# Altium footprint library ESKDPcbLib.PcbLib: 608 footprints (part 25 of 38)
Each footprint in its own frame and in the unit in brackets; x right, y up, seen from the top. Pads: shape width x height; smd on the part's side, far side on the other; paste and mask are expansions set on the pad; w line width, h text height; cw(c..) or ccw(c..) is an arc to the next point about the centre after c.
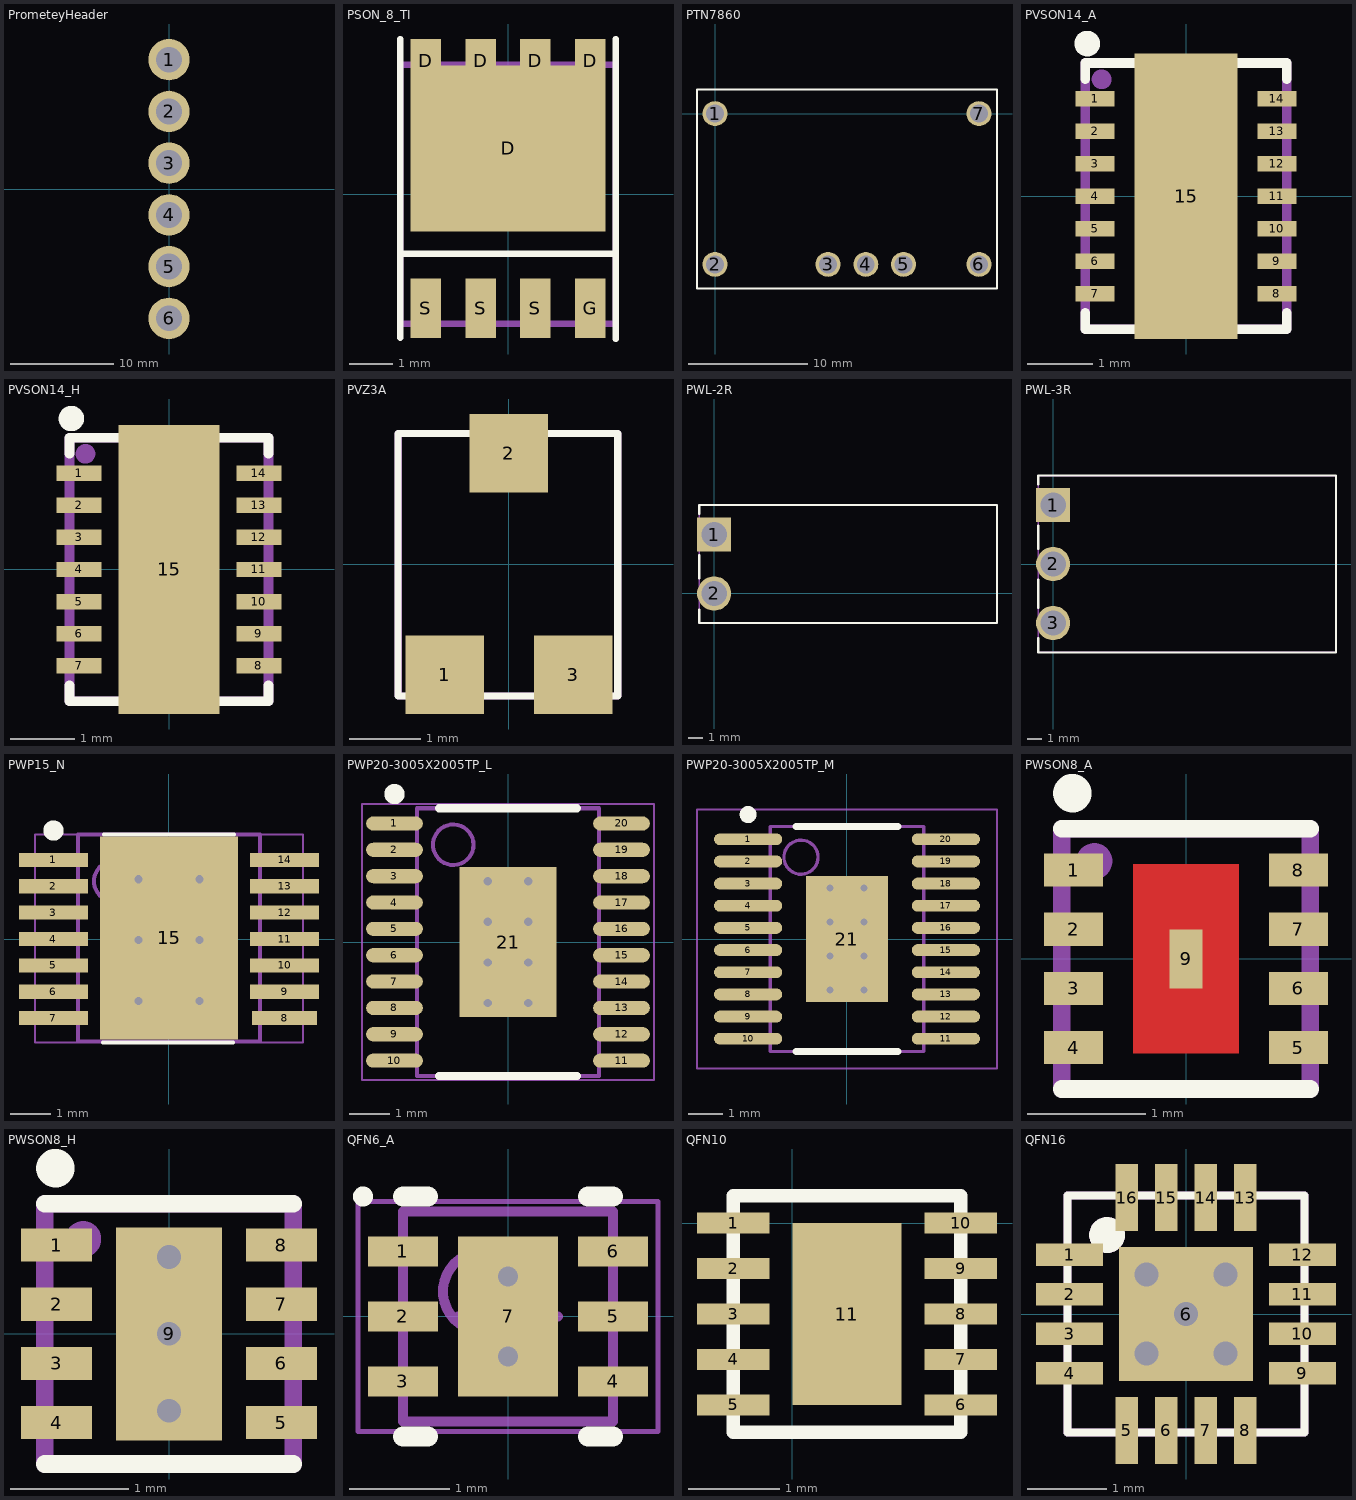
[diagram p24: the footprints below, top view; thin cyan lines are the x and y axes]

## PrometeyHeader [mm]
pads (6):
  round 4 hole 2.5: 1(0,12.5) 2(0,7.5) 3(0,2.5) 4(0,-2.5) 5(0,-7.5) 6(0,-12.5)

## PSON_8_TI [mm]
height 1
pads (9):
  rect 0.71x1 smd: D(-1.905,3.098) D(-0.635,3.098) D(0.635,3.098) D(1.905,3.098)
  rect 4.52x3.85 smd: D(0,1.064)
  rect 0.71x1.375 smd: G(1.905,-2.641) S(-1.905,-2.641) S(-0.635,-2.641) S(0.635,-2.641)
Top Overlay:
  lines w0.15: -2.5,-3.325 -2.5,3.6 ; -2.5,-1.375 2.5,-1.375 ; 2.5,-3.35 2.5,3.6
Mechanical 7:
  lines w0.15: -2.5,-3 -2.5,3 2.5,3 2.5,-3 -2.5,-3
Mechanical 10:
  text ".Designator" at -1.075,-4.2 h0.7
  text ".Comment" at -1.125,4.05 h0.7
3D body: height 1, standoff 0.05, extent -2.5,-3 2.5,3

## PTN7860 [mm]
pads (7):
  round 2.1 hole 1.5 mask+0: 1(0,0) 2(0,-12.7) 3(9.52,-12.7) 4(12.7,-12.7) 5(15.88,-12.7) 6(22.23,-12.7) 7(22.23,0)
Top Overlay:
  lines w0.15: -1.52,-14.73 -1.52,2.03 23.75,2.03 23.75,-14.73 -1.52,-14.73
3D body: height 9, standoff 2, extent -1.52,-14.73 23.75,2.03

## PVSON14_A [mm]
pads (15):
  rect 0.6x0.24 smd: 1(-1.4,1.5) 2(-1.4,1) 3(-1.4,0.5) 4(-1.4,0) 5(-1.4,-0.5) 6(-1.4,-1) 7(-1.4,-1.5) 8(1.4,-1.5) 9(1.4,-1) 10(1.4,-0.5) 11(1.4,0) 12(1.4,0.5) 13(1.4,1) 14(1.4,1.5)
  rect 1.58x4.4 smd: 15(0,0)
Top Overlay:
  circle w0.254: c-1.521,2.35 r0.071
  lines w0.15: -1.55,-1.8 -1.55,-2.05 1.55,-2.05 1.55,-1.8 ; -1.55,1.8 -1.55,2.05 1.55,2.05 1.55,1.8
Mechanical 7:
  circle w0.254: c-1.3,1.8 r0.025
  lines w0.15: -1.55,-2.05 1.55,-2.05 1.55,2.05 -1.55,2.05 -1.55,-2.05
Mechanical 10:
  text ".Designator" at -1.25,3.075 h0.8
  text ".Comment" at -1.225,2.5 h0.6
3D body: height 1, standoff 0, extent -1.575,-2.075 1.575,2.075

## PVSON14_H [mm]
pads (15):
  rect 0.7x0.24 smd: 1(-1.4,1.5) 2(-1.4,1) 3(-1.4,0.5) 4(-1.4,0) 5(-1.4,-0.5) 6(-1.4,-1) 7(-1.4,-1.5) 8(1.4,-1.5) 9(1.4,-1) 10(1.4,-0.5) 11(1.4,0) 12(1.4,0.5) 13(1.4,1) 14(1.4,1.5)
  rect 1.58x4.5 smd: 15(0,0)
Top Overlay:
  circle w0.254: c-1.521,2.35 r0.071
  lines w0.15: -1.55,-1.8 -1.55,-2.05 1.55,-2.05 1.55,-1.8 ; -1.55,1.8 -1.55,2.05 1.55,2.05 1.55,1.8
Mechanical 7:
  circle w0.254: c-1.3,1.8 r0.025
  lines w0.15: -1.55,-2.05 1.55,-2.05 1.55,2.05 -1.55,2.05 -1.55,-2.05
Mechanical 10:
  text ".Designator" at -1.25,3.075 h0.8
  text ".Comment" at -1.225,2.5 h0.6
3D body: height 1, standoff 0, extent -1.575,-2.075 1.575,2.075

## PVZ3A [mm] "подстроечный резистор"
pads (3):
  rect 1.1x1.1 smd: 1(-0.9,-1.55) 2(0,1.55) 3(0.9,-1.55)
Top Overlay:
  lines w0.1: -1.55,-1.85 -1.55,1.825 1.525,1.825 1.525,-1.85 -1.55,-1.85
Mechanical 7:
  lines w0.1: -1.55,-1.85 -1.55,1.825 1.525,1.825 1.525,-1.85 -1.55,-1.85
Mechanical 10:
  text ".Designator" at 2.175,-0.75 h1.52
  text ".Comment" at 2.225,0.35 h1.52
3D body: height 1.95, standoff 0, extent -1.55,-1.85 1.55,1.84

## PWL-2R [mm]
height 10.2
pads (2):
  rect 2.3x2.3 hole 1.7: 1(0,3.96)
  round 2.3 hole 1.7: 2(0,0)
Top Overlay:
  lines w0.15: -1,-1.98 19,-1.98 19,5.94 -1,5.94 -1,5.35 ; -1,-1.975 -1,-1.1 ; -1,1 -1,2.575
Mechanical 7:
  lines w0.1: -1,-1.98 -1,5.94 19,5.94 19,-1.98 -1,-1.98
Mechanical 10:
  text ".Designator" at 7.945,7.23 h0.8
  text ".Comment" at 7.955,6.66 h0.6
3D body: height 10.2, standoff 0, extent -1,-1.98 19,5.94

## PWL-3R [mm]
height 10.2
pads (3):
  rect 2.3x2.3 hole 1.7: 1(0,3.96)
  round 2.3 hole 1.7: 2(0,0) 3(0,-3.96)
Top Overlay:
  lines w0.15: -1,-4.975 -1,-5.94 19,-5.94 19,5.94 -1,5.94 -1,5.35 ; -1,-2.95 -1,-1.05 ; -1,1.025 -1,2.575
Mechanical 7:
  lines w0.1: -1,-5.94 -1,5.94 19,5.94 19,-5.94 -1,-5.94
Mechanical 10:
  text ".Comment" at 7.955,6.66 h0.6
  text ".Designator" at 7.945,7.23 h0.8
3D body: height 10.2, standoff 0, extent -1,-5.94 19,5.94

## PWP15_N [mm] "TSOP, 20-Leads, Body 6.5x4.4mm, Pitch 0.65mm, Thermal Pad 3.7x2.4 mm, IPC Medium Density"
height 1.2
pads (15):
  rect 1.7x0.35 smd: 1(-2.85,1.95) 2(-2.85,1.3) 3(-2.85,0.65) 4(-2.85,0) 5(-2.85,-0.65) 6(-2.85,-1.3) 7(-2.85,-1.95) 9(2.85,-1.3) 10(2.85,-0.65) 11(2.85,0) 12(2.85,0.65) 13(2.85,1.3) 14(2.85,1.95)
  rect 1.6x0.35 smd: 8(2.85,-1.95)
  rect 3.4x5 smd: 15(0,0.025)
via 0.75,1.475 diameter 0.5 hole 0.2
via 0.75,-0.025 diameter 0.5 hole 0.2
via 0.75,-1.525 diameter 0.5 hole 0.2
via -0.75,-1.525 diameter 0.5 hole 0.2
via -0.75,-0.025 diameter 0.5 hole 0.2
via -0.75,1.475 diameter 0.5 hole 0.2
Top Overlay:
  circle w0.25: c-2.85,2.675 r0.125
  lines w0.1: -1.625,-2.55 1.575,-2.55 ; -1.6,2.575 1.6,2.575
Mechanical 7:
  lines w0.05: -3.3,2.55 -3.3,-2.55 3.3,-2.55 3.3,2.55 ; -3.3,2.575 3.3,2.575
Mechanical 9:
  circle w0.1: c-1.35,1.425 r0.5
  lines w0.1: -2.25,-2.525 2.25,-2.525 2.25,2.575 -2.25,2.575 -2.25,-2.525
3D body: height 1.2, standoff 0.05, extent -2.25,-2.55 2.25,2.325

## PWP20-3005X2005TP_L [mm] "TSOP, 20-Leads, Body 6.5x4.4mm, Pitch 0.65mm, Thermal Pad 3.7x2.4 mm, IPC High Density"
height 1.2
pads (21):
  oval 1.4x0.35 smd: 1(-2.8,2.925) 2(-2.8,2.275) 3(-2.8,1.625) 4(-2.8,0.975) 5(-2.8,0.325) 6(-2.8,-0.325) 7(-2.8,-0.975) 8(-2.8,-1.625) 9(-2.8,-2.275) 10(-2.8,-2.925) 11(2.8,-2.925) 12(2.8,-2.275) 13(2.8,-1.625) 14(2.8,-0.975) 15(2.8,-0.325) 16(2.8,0.325) 17(2.8,0.975) 18(2.8,1.625) 19(2.8,2.275) 20(2.8,2.925)
  rect 2.4x3.7 smd: 21(0,0)
via 0.5,1.5 diameter 0.5 hole 0.2
via 0.5,0.5 diameter 0.5 hole 0.2
via 0.5,-0.5 diameter 0.5 hole 0.2
via 0.5,-1.5 diameter 0.5 hole 0.2
via -0.5,-1.5 diameter 0.5 hole 0.2
via -0.5,-0.5 diameter 0.5 hole 0.2
via -0.5,0.5 diameter 0.5 hole 0.2
via -0.5,1.5 diameter 0.5 hole 0.2
Top Overlay:
  circle w0.25: c-2.8,3.65 r0.125
  lines w0.2: -1.7,-3.3 1.7,-3.3 ; -1.7,3.3 1.7,3.3
Mechanical 13:
  circle w0.1: c-1.35,2.4 r0.5
  lines w0.1: -2.25,-3.3 -2.25,3.3 2.25,3.3 2.25,-3.3 -2.25,-3.3
Mechanical 15:
  lines w0.05: -3.6,-3.4 -3.6,3.4 3.6,3.4 3.6,-3.4 -3.6,-3.4
  lines w0.1: -0.5,0 0.5,0 ; 0,-0.5 0,0.5
3D body: height 1.2, standoff 0.05, extent -2.25,-3.3 2.25,3.3

## PWP20-3005X2005TP_M [mm] "TSOP, 20-Leads, Body 6.5x4.4mm, Pitch 0.65mm, Thermal Pad 3.7x2.4 mm, IPC Low Density"
height 1.2
pads (21):
  oval 2x0.35 smd: 1(-2.9,2.925) 2(-2.9,2.275) 3(-2.9,1.625) 4(-2.9,0.975) 5(-2.9,0.325) 6(-2.9,-0.325) 7(-2.9,-0.975) 8(-2.9,-1.625) 9(-2.9,-2.275) 10(-2.9,-2.925) 11(2.9,-2.925) 12(2.9,-2.275) 13(2.9,-1.625) 14(2.9,-0.975) 15(2.9,-0.325) 16(2.9,0.325) 17(2.9,0.975) 18(2.9,1.625) 19(2.9,2.275) 20(2.9,2.925)
  rect 2.4x3.7 smd: 21(0,0)
via 0.5,1.5 diameter 0.5 hole 0.2
via 0.5,0.5 diameter 0.5 hole 0.2
via 0.5,-0.5 diameter 0.5 hole 0.2
via 0.5,-1.5 diameter 0.5 hole 0.2
via -0.5,-1.5 diameter 0.5 hole 0.2
via -0.5,-0.5 diameter 0.5 hole 0.2
via -0.5,0.5 diameter 0.5 hole 0.2
via -0.5,1.5 diameter 0.5 hole 0.2
Top Overlay:
  circle w0.25: c-2.9,3.65 r0.125
  lines w0.2: -1.5,-3.3 1.5,-3.3 ; -1.5,3.3 1.5,3.3
Mechanical 13:
  circle w0.1: c-1.35,2.4 r0.5
  lines w0.1: -2.25,-3.3 -2.25,3.3 2.25,3.3 2.25,-3.3 -2.25,-3.3
Mechanical 15:
  lines w0.05: -4.4,-3.8 -4.4,3.8 4.4,3.8 4.4,-3.8 -4.4,-3.8
  lines w0.1: -0.5,0 0.5,0 ; 0,-0.5 0,0.5
3D body: height 1.2, standoff 0.05, extent -2.25,-3.3 2.25,3.3

## PWSON8_A [mm]
pads (9):
  rect 0.5x0.28 smd: 1(-0.95,0.75) 2(-0.95,0.25) 3(-0.95,-0.25) 4(-0.95,-0.75) 5(0.95,-0.75) 6(0.95,-0.25) 7(0.95,0.25) 8(0.95,0.75)
  rect 0.28x0.5 smd: 9(0,0)
Top Layer:
  rectangle: -0.45,-0.8 0.45,0.8
Top Overlay:
  circle w0.254: c-0.96,1.4 r0.035
  lines w0.15: -1.05,-1.1 1.05,-1.1 ; -1.05,1.1 1.05,1.1
Mechanical 7:
  circle w0.254: c-0.775,0.825 r0.025
  lines w0.15: -1.05,-1.1 -1.05,1.1 1.05,1.1 1.05,-1.1 -1.05,-1.1
Mechanical 10:
  text ".Designator" at -0.5,2.175 h0.8
  text ".Comment" at -0.475,1.6 h0.6
3D body: height 0.8, standoff 0, extent -1.025,-1.05 1.075,1.05

## PWSON8_H [mm]
pads (9):
  rect 0.6x0.28 smd: 1(-0.95,0.75) 2(-0.95,0.25) 3(-0.95,-0.25) 4(-0.95,-0.75) 5(0.95,-0.75) 6(0.95,-0.25) 7(0.95,0.25) 8(0.95,0.75)
  rect 0.9x1.8 smd: 9(0,0)
via 0,0 diameter 0.5 hole 0.2
via 0,0.65 diameter 0.5 hole 0.2
via 0,-0.65 diameter 0.5 hole 0.2
Top Overlay:
  circle w0.254: c-0.96,1.4 r0.035
  lines w0.15: -1.05,-1.1 1.05,-1.1 ; -1.05,1.1 1.05,1.1
Mechanical 7:
  circle w0.254: c-0.725,0.8 r0.025
  lines w0.15: -1.05,-1.1 1.05,-1.1 1.05,1.1 -1.05,1.1 -1.05,-1.1
Mechanical 10:
  text ".Comment" at -0.475,1.6 h0.6
  text ".Designator" at -0.5,2.175 h0.8
3D body: height 0.8, standoff 0, extent -1.05,-1.05 1.05,1.05

## QFN6_A [mm]
pads (7):
  rect 0.7x0.3 smd paste-0.025 mask+0.07: 1(-1.05,0.65) 2(-1.05,0) 3(-1.05,-0.65) 4(1.05,-0.65) 5(1.05,0) 6(1.05,0.65)
  rect 1x1.6 smd paste-0.5 mask+0.07: 7(0,0)
via 0,-0.4 diameter 0.5 hole 0.2
via 0,0.4 diameter 0.5 hole 0.2
Top Overlay:
  circle w0.1: c-1.45,1.2 r0.05
  lines w0.2: -1.05,-1.2 -0.8,-1.2 ; -1.05,1.2 -0.8,1.2 ; 0.8,-1.2 1.05,-1.2 ; 0.8,1.2 1.05,1.2
Top Paste:
  rectangle: -0.4,-0.7 0.4,0.7
Mechanical 13:
  circle w0.1: c-0.25,0.25 r0.4
  lines w0.1: -1.05,-1.05 1.05,-1.05 1.05,1.05 -1.05,1.05 -1.05,-1.05
Mechanical 15:
  lines w0.05: -1.5,-1.15 1.5,-1.15 1.5,1.15 -1.5,1.15 -1.5,-1.15
  lines w0.1: -0.5,0 0.5,0 ; 0,-0.5 0,0.5
3D body: height 0.8, standoff 0, extent -1.05,-1.05 1.05,1.05

## QFN10 [mm]
pads (11):
  rect 0.8x0.23 smd mask+0: 1(-0.65,0) 2(-0.65,-0.5) 3(-0.65,-1) 4(-0.65,-1.5) 5(-0.65,-2) 6(1.85,-2) 7(1.85,-1.5) 8(1.85,-1) 9(1.85,-0.5) 10(1.85,0)
  rect 1.2x2 smd mask+0: 11(0.6,-1)
Top Overlay:
  lines w0.15: -0.65,-2.3 1.85,-2.3 1.85,0.3 -0.65,0.3 -0.65,-2.3
3D body: height 0.8, standoff 0, extent -0.65,-2.3 1.84,0.3

## QFN16 [mm]
pads (17):
  rect 0.85x0.28 smd: 1(-1.475,0.75) 2(-1.475,0.25) 3(-1.475,-0.25) 4(-1.475,-0.75) 9(1.475,-0.75) 10(1.475,-0.25) 11(1.475,0.25) 12(1.475,0.75)
  rect 0.28x0.85 smd: 5(-0.75,-1.475) 6(-0.25,-1.475) 7(0.25,-1.475) 8(0.75,-1.475) 13(0.75,1.475) 14(0.25,1.475) 15(-0.25,1.475) 16(-0.75,1.475)
  rect 1.7x1.7 smd: 6(0,0)
via 0.5,-0.5 diameter 0.5 hole 0.3
via -0.5,-0.5 diameter 0.5 hole 0.3
via 0.5,0.5 diameter 0.5 hole 0.3
via -0.5,0.5 diameter 0.5 hole 0.3
via 0,0 diameter 0.5 hole 0.3
Top Overlay:
  circle w0.254: c-1,1 r0.1
  lines w0.1: -1.5,-1.5 -1.5,1.5 1.5,1.5 1.5,-1.5 -1.5,-1.5
Mechanical 7:
  circle w0.254: c-1,1 r0.1
  lines w0.1: -1.5,-1.5 -1.5,1.5 1.5,1.5 1.5,-1.5 -1.5,-1.5
Mechanical 10:
  text ".Designator" at -1.75,3.5 h1.52
  text ".Comment" at -1.75,2.5 h1.52
3D body: height 0.9, standoff 0, extent -1.501,-1.501 1.501,1.501